# Altium footprint library ThanhNT.PcbLib: 579 footprints (part 1 of 37)
Each footprint in its own frame and in the unit in brackets; x right, y up, seen from the top. Pads: shape width x height; smd on the part's side, far side on the other; paste and mask are expansions set on the pad; w line width, h text height; cw(c..) or ccw(c..) is an arc to the next point about the centre after c.
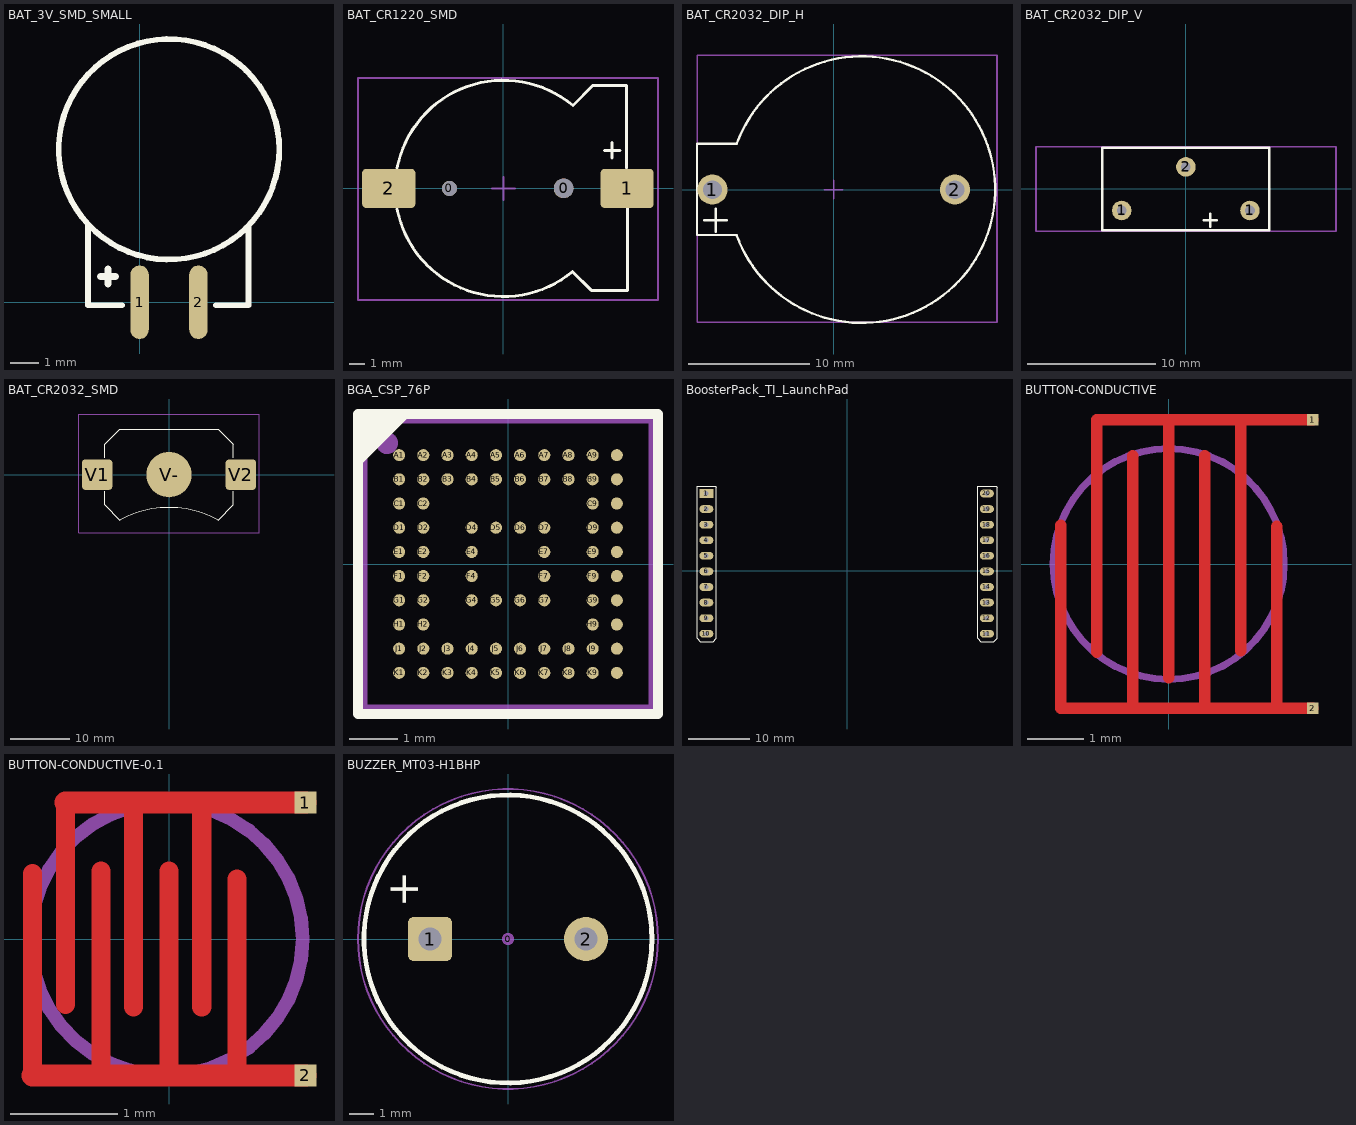
[diagram p0: the footprints below, top view; thin cyan lines are the x and y axes]

## 3D_MODEL_MICRO_SD_CARD [mm]
3D body "Micro_SD_Card.step": height 1.95, standoff 0.97, extent -5.678,-7.373 5.322,7.627

## 3D_MODEL_MICRO_SIM_CARD [mm]
3D body "microsim.STEP": height 1.7, standoff 0.94, extent -5.853,-8.16 6.147,6.84

## 3D_MODEL_MINI_PCIE_FULL CARD [mm]
3D body "PCI Express Mini Card (Full-Mini Card).step": height 6.9, standoff 2.15, extent 0,0 50.95,30

## 3D_MODEL_NUT_A4_SS_M2 [mm]
3D body "Hexagon nut ISO 4032 (DIN 934) - M2.STEP": height 4.65, standoff 3.05, extent -2.31,-2 2.309,2

## 3D_MODEL_SCREW_M2x8 [mm]
3D body "Hexagon head screw ISO 4017 (DIN 933) - M2 × 8.step": height 6.4, standoff -3, extent -2.31,-2 2.309,2

## 3D_MODEL_SPACER 2.5/4.5X1.5MM [mm]
3D body: height 1.5, standoff 0, extent -2.268,-2.254 2.232,2.245

## BAT_3V_SMD_SMALL [mil]
pads (2):
  oval 25x100 smd: 1(0,0) 2(80,0)
Top Overlay:
  circle w7.87: c40,208 r150
  lines w7.87: -70,106 -70,-4 -24,-4 ; 104,-4 148,-4 148,103
  lines w10: -53,35 -33,35 ; -43,25 -43,45

## BAT_CR1220_SMD [mm]
pads (4):
  round 1 hole 1: 0(-3.6,0)
  round 1.3 hole 1.3: 0(4,0)
  rrect20% 3.54x2.6 smd: 1(8.23,0) 2(-7.63,0)
Top Overlay:
  lines w0.2: -7.068,-1.372 ccw(c0,0) 4.602,-5.537 5.847,-6.782 8.255,-6.782 8.255,-1.321 ; -7.068,1.372 cw(c0,0) 4.624,5.519 5.962,6.858 8.204,6.858 8.204,1.372 ; 6.731,2.54 7.747,2.54 ; 7.239,2.032 7.239,3.048
Mechanical 15:
  lines w0.127: -0.762,0 0.762,0 ; 0,-0.762 0,0.762 ; -9.677,-7.417 10.287,-7.417 10.287,7.341 9.804,7.341 -9.677,7.341 -9.677,-7.417
3D body "User Library-Battery Holder for CR1220 SMD.STEP": height 4.26, standoff -0.49, extent -8.968,-7.391 9.832,7.357

## BAT_CR2032_DIP_H [mm]
pads (2):
  round 2.5 hole 1.55: 1(-10.05,0) 2(10.05,0)
Top Overlay:
  lines w0.2: -10.719,-2.54 -8.839,-2.54 ; -9.779,-3.48 -9.779,-1.6 ; -8.099,-3.759 -11.328,-3.759 -11.328,3.785 -8.047,3.785 ; -8.048,-3.776 ccw(c2.337,0) -8.047,3.778
Mechanical 15:
  lines w0.127: -0.762,0 0.762,0 ; 0,-0.762 0,0.762 ; -11.303,-10.998 13.538,-10.998 13.538,11.151 -11.303,11.151 -11.303,-10.998
3D body "User Library-CR2032_HOR_HOLD.STEP": height 8.51, standoff -3.99, extent -11.112,-10.974 13.388,11.026

## BAT_CR2032_DIP_V [mil]
pads (3):
  round 60 hole 30: 1(-196.85,-66.93) 1(196.85,-66.93) 2(0,66.93)
Top Overlay:
  lines w7.87: 55,-96.93 95,-96.93 ; 75,-116.93 75,-76.93 ; -256,-126.93 256,-126.93 256,125.07 -256,125.07 -256,-126.93
Mechanical 15:
  lines w5: -460,129.07 -460,-130.93 461,-130.93 461,129.07 -459,129.07
3D body "User Library-CR2032 Battery Holder-Dip180.STEP": height 719.01, standoff -117.61, extent -454.72,-126.91 454.65,125.06

## BAT_CR2032_SMD [mm]
pads (3):
  rrect20% 5.08x5.08 smd: V1(-12.065,0) V2(12.065,0)
  rrect100% 7.62x7.62 smd: V-(0,0)
Top Overlay:
  lines w0.2: -10.795,-2.819 -10.795,-5.08 -8.255,-7.62 cw(c0,-22.86) 8.255,-7.62 10.795,-5.08 10.795,-2.819 ; -10.795,2.819 -10.795,5.08 -8.255,7.62 8.255,7.62 10.795,5.08 10.795,2.819
Mechanical 15:
  lines w0.127: -0.762,0 0.762,0 ; 0,-0.762 0,0.762 ; -15.138,-9.728 -15.138,10.185 15.138,10.185 15.138,-9.728 -15.138,-9.728
3D body "SW3dPS-3002.STEP": height 3.98, standoff 0.01, extent -15.418,-9.804 15.316,10.249

## BGA_CSP_76P [mm]
pads (76):
  round 0.25 smd mask+0.05: A1(-2.25,2.25) A2(-1.75,2.25) A3(-1.25,2.25) A4(-0.75,2.25) A5(-0.25,2.25) A6(0.25,2.25) A7(0.75,2.25) A8(1.25,2.25) A9(1.75,2.25) A10(2.25,2.25) B1(-2.25,1.75) B2(-1.75,1.75) B3(-1.25,1.75) B4(-0.75,1.75) B5(-0.25,1.75) B6(0.25,1.75) B7(0.75,1.75) B8(1.25,1.75) B9(1.75,1.75) B10(2.25,1.75) C1(-2.25,1.25) C2(-1.75,1.25) C9(1.75,1.25) C10(2.25,1.25) D1(-2.25,0.75) D2(-1.75,0.75) D4(-0.75,0.75) D5(-0.25,0.75) D6(0.25,0.75) D7(0.75,0.75) D9(1.75,0.75) D10(2.25,0.75) E1(-2.25,0.25) E2(-1.75,0.25) E4(-0.75,0.25) E7(0.75,0.25) E9(1.75,0.25) E10(2.25,0.25) F1(-2.25,-0.25) F2(-1.75,-0.25) F4(-0.75,-0.25) F7(0.75,-0.25) F9(1.75,-0.25) F10(2.25,-0.25) G1(-2.25,-0.75) G2(-1.75,-0.75) G4(-0.75,-0.75) G5(-0.25,-0.75) G6(0.25,-0.75) G7(0.75,-0.75) G9(1.75,-0.75) G10(2.25,-0.75) H1(-2.25,-1.25) H2(-1.75,-1.25) H9(1.75,-1.25) H10(2.25,-1.25) J1(-2.25,-1.75) J2(-1.75,-1.75) J3(-1.25,-1.75) J4(-0.75,-1.75) J5(-0.25,-1.75) J6(0.25,-1.75) J7(0.75,-1.75) J8(1.25,-1.75) J9(1.75,-1.75) J10(2.25,-1.75) K1(-2.25,-2.25) K2(-1.75,-2.25) K3(-1.25,-2.25) K4(-0.75,-2.25) K5(-0.25,-2.25) K6(0.25,-2.25) K7(0.75,-2.25) K8(1.25,-2.25) K9(1.75,-2.25) K10(2.25,-2.25)
Top Overlay:
  region: -3.1,3.1 -2,3.1 -3.1,2
  lines w0.2: -3.1,-3.1 3.1,-3.1 3.1,3.1 -3.1,3.1 -3.1,-3.1
Mechanical 16:
  circle w0.254: c-2.5,2.5 r0.1
  lines w0.2: -3,-3 3,-3 3,3 -3,3 -3,-3
3D body: height 0.8, standoff 0.15, extent -3.1,-3.1 3.1,3.1

## BoosterPack_TI_LaunchPad [mil] "20PIN_LP"
pads (20):
  rect 90x60 hole 30: 1(-905,495)
  oval 90x50 hole 30: 2(-905,395) 3(-905,295) 4(-905,195) 5(-905,95) 6(-905,-5) 7(-905,-105) 8(-905,-205) 9(-905,-305) 10(-905,-405) 11(895,-405) 12(895,-305) 13(895,-205) 14(895,-105) 15(895,-5) 16(895,95) 17(895,195) 18(895,295) 19(895,395) 20(895,495)
Top Overlay:
  lines w7.87: -965,-435 -945,-455 -860,-455 -840,-435 -840,535 -845,540 -965,540 -965,-435 ; 835,-435 835,540 955,540 960,535 960,-435 940,-455 855,-455 835,-435

## BUTTON-CONDUCTIVE [mil]
pads (2):
  rect 8x8 smd: 1(100,100) 2(100,-100)
Top Layer:
  lines w8: -75,27 -75,-100 100,-100 ; -50,-61 -50,100 100,100 ; -25,-100 -25,75 ; 0,-79 0,100 ; 25,-100 25,75 ; 50,-60 50,100 ; 75,-100 75,26
Top Solder:
  circle w79: c0,0 r40
Mechanical 16:
  circle w5: c0,0 r80

## BUTTON-CONDUCTIVE-0.1 [mil]
pads (2):
  rect 8x8 smd: 1(50,50) 2(50,-50)
Top Layer:
  lines w7: -50,-50 -50,24 ; -38,-24 -38,50 ; -25,-50 -25,25 ; -13,-25 -13,50 ; 0,-50 0,25 ; 12,-25 12,50 ; 25,-50 25,22
  lines w8: -50,-50 -25,-50 0,-50 25,-50 50,-50 ; -38,50 -13,50 12,50 50,50
Top Solder:
  rectangle: -55,-55 55,55
Mechanical 16:
  circle w5: c-1,0 r50

## BUZZER_MT03-H1BHP [mil]
height 354.33
pads (3):
  round 20 on Mech15: 0(0,0)
  rrect25% 72x72 / inner rrect25% 72x72 / far side rrect25% 90x90 hole 38: 1(-127.95,0)
  round 72 / inner round 72 / far side round 90 hole 38: 2(127.95,0)
Top Overlay:
  circle w7.87: c0,0 r236.22
  text "+" at -129.92,51.18 h90
Mechanical 13:
  circle w3: c0.14,-0.47 r236.22
Mechanical 15:
  circle w3: c0,0 r246.06
3D body "TH pad - 28 pin x 90.STEP": height 50, standoff 0, extent -172.59,-44.91 -82.95,44.92
3D body "TH pad - 28 pin x 90.STEP": height 50, standoff 0, extent 83.31,-44.9 172.96,44.92
3D body "3100-xxx speaker 8.5mm.STEP": height 354.33, standoff -110.24, extent -246.02,-246.04 246.07,246.06